# Altium footprint library Header.PcbLib: 297 footprints (part 14 of 23) (continued)
## MHDR1X22-254P [mm] "Male Header 1X22 with 2.54 mm Pitch"
height 8.4
pads (22):
  rect 1.5x1.5 hole 0.9: 1(-26.67,0)
  round 1.5 hole 0.9: 2(-24.13,0) 3(-21.59,0) 4(-19.05,0) 5(-16.51,0) 6(-13.97,0) 7(-11.43,0) 8(-8.89,0) 9(-6.35,0) 10(-3.81,0) 11(-1.27,0) 12(1.27,0) 13(3.81,0) 14(6.35,0) 15(8.89,0) 16(11.43,0) 17(13.97,0) 18(16.51,0) 19(19.05,0) 20(21.59,0) 21(24.13,0) 22(26.67,0)
Top Overlay:
  drawing of 155 lines, arcs and shapes, not listed
  text "1" at -26.162,-1.936 h1
  text "1" at -26.162,-1.936 h1
  text "2" at -23.622,-2.364 h1
  text "3" at -21.082,-2.364 h1
  text "4" at -18.542,-2.412 h1
  text "5" at -16.002,-2.364 h1
  text "6" at -13.462,-2.317 h1
  text "7" at -10.922,-2.364 h1
  text "8" at -8.382,-2.364 h1
  text "9" at -5.842,-2.317 h1
  text "10" at -3.302,-3.097 h1
  text "11" at -0.762,-2.669 h1
  text "12" at 1.778,-3.097 h1
  text "13" at 4.318,-3.097 h1
  text "14" at 6.858,-3.145 h1
  text "15" at 9.398,-3.097 h1
  text "16" at 11.938,-3.05 h1
  text "17" at 14.478,-3.097 h1
  text "18" at 17.018,-3.097 h1
  text "19" at 19.558,-3.05 h1
  text "20" at 22.098,-3.254 h1
  text "21" at 24.638,-2.826 h1
  text "22" at 27.178,-3.254 h1
3D body "PIN.STEP": height 8.43, standoff -2.49, extent 25.4,-1.27 27.94,1.27
3D body "PIN_mid.STEP": height 8.43, standoff -2.49, extent 22.86,-1.27 25.4,1.27
3D body "PIN_mid.STEP": height 8.43, standoff -2.49, extent 20.32,-1.27 22.86,1.27
3D body "PIN_mid.STEP": height 8.43, standoff -2.49, extent 17.78,-1.27 20.32,1.27
3D body "PIN_mid.STEP": height 8.43, standoff -2.49, extent 15.24,-1.27 17.78,1.27
3D body "PIN_mid.STEP": height 8.43, standoff -2.49, extent 12.7,-1.27 15.24,1.27
3D body "PIN_mid.STEP": height 8.43, standoff -2.49, extent 10.16,-1.27 12.7,1.27
3D body "PIN_mid.STEP": height 8.43, standoff -2.49, extent 7.62,-1.27 10.16,1.27
3D body "PIN_mid.STEP": height 8.43, standoff -2.49, extent 5.08,-1.27 7.62,1.27
3D body "PIN_mid.STEP": height 8.43, standoff -2.49, extent 2.54,-1.27 5.08,1.27
3D body "PIN_mid.STEP": height 8.43, standoff -2.49, extent 0,-1.27 2.54,1.27
3D body "PIN_mid.STEP": height 8.43, standoff -2.49, extent -2.54,-1.27 0,1.27
3D body "PIN_mid.STEP": height 8.43, standoff -2.49, extent -5.08,-1.27 -2.54,1.27
3D body "PIN_mid.STEP": height 8.43, standoff -2.49, extent -7.62,-1.27 -5.08,1.27
3D body "PIN_mid.STEP": height 8.43, standoff -2.49, extent -10.16,-1.27 -7.62,1.27
3D body "PIN_mid.STEP": height 8.43, standoff -2.49, extent -12.7,-1.27 -10.16,1.27
3D body "PIN_mid.STEP": height 8.43, standoff -2.49, extent -15.24,-1.27 -12.7,1.27
3D body "PIN_mid.STEP": height 8.43, standoff -2.49, extent -17.78,-1.27 -15.24,1.27
3D body "PIN_mid.STEP": height 8.43, standoff -2.49, extent -20.32,-1.27 -17.78,1.27
3D body "PIN_mid.STEP": height 8.43, standoff -2.49, extent -22.86,-1.27 -20.32,1.27
3D body "PIN_mid.STEP": height 8.43, standoff -2.49, extent -25.4,-1.27 -22.86,1.27
3D body "PIN.STEP": height 8.43, standoff -2.49, extent -27.94,-1.27 -25.4,1.27

## MHDR1X22-254P - E [mm] "Male Header 1X22 with 2.54 mm Pitch"
height 8.4
pads (22):
  rect 1.5x1.5 hole 0.9: 1(-26.67,0)
  round 1.5 hole 0.9: 2(-24.13,0) 3(-21.59,0) 4(-19.05,0) 5(-16.51,0) 6(-13.97,0) 7(-11.43,0) 8(-8.89,0) 9(-6.35,0) 10(-3.81,0) 11(-1.27,0) 12(1.27,0) 13(3.81,0) 14(6.35,0) 15(8.89,0) 16(11.43,0) 17(13.97,0) 18(16.51,0) 19(19.05,0) 20(21.59,0) 21(24.13,0) 22(26.67,0)
Top Overlay:
  drawing of 155 lines, arcs and shapes, not listed
3D body "PIN.STEP": height 8.43, standoff -2.49, extent 25.4,-1.27 27.94,1.27
3D body "PIN_mid.STEP": height 8.43, standoff -2.49, extent 22.86,-1.27 25.4,1.27
3D body "PIN_mid.STEP": height 8.43, standoff -2.49, extent 20.32,-1.27 22.86,1.27
3D body "PIN_mid.STEP": height 8.43, standoff -2.49, extent 17.78,-1.27 20.32,1.27
3D body "PIN_mid.STEP": height 8.43, standoff -2.49, extent 15.24,-1.27 17.78,1.27
3D body "PIN_mid.STEP": height 8.43, standoff -2.49, extent 12.7,-1.27 15.24,1.27
3D body "PIN_mid.STEP": height 8.43, standoff -2.49, extent 10.16,-1.27 12.7,1.27
3D body "PIN_mid.STEP": height 8.43, standoff -2.49, extent 7.62,-1.27 10.16,1.27
3D body "PIN_mid.STEP": height 8.43, standoff -2.49, extent 5.08,-1.27 7.62,1.27
3D body "PIN_mid.STEP": height 8.43, standoff -2.49, extent 2.54,-1.27 5.08,1.27
3D body "PIN_mid.STEP": height 8.43, standoff -2.49, extent 0,-1.27 2.54,1.27
3D body "PIN_mid.STEP": height 8.43, standoff -2.49, extent -2.54,-1.27 0,1.27
3D body "PIN_mid.STEP": height 8.43, standoff -2.49, extent -5.08,-1.27 -2.54,1.27
3D body "PIN_mid.STEP": height 8.43, standoff -2.49, extent -7.62,-1.27 -5.08,1.27
3D body "PIN_mid.STEP": height 8.43, standoff -2.49, extent -10.16,-1.27 -7.62,1.27
3D body "PIN_mid.STEP": height 8.43, standoff -2.49, extent -12.7,-1.27 -10.16,1.27
3D body "PIN_mid.STEP": height 8.43, standoff -2.49, extent -15.24,-1.27 -12.7,1.27
3D body "PIN_mid.STEP": height 8.43, standoff -2.49, extent -17.78,-1.27 -15.24,1.27
3D body "PIN_mid.STEP": height 8.43, standoff -2.49, extent -20.32,-1.27 -17.78,1.27
3D body "PIN_mid.STEP": height 8.43, standoff -2.49, extent -22.86,-1.27 -20.32,1.27
3D body "PIN_mid.STEP": height 8.43, standoff -2.49, extent -25.4,-1.27 -22.86,1.27
3D body "PIN.STEP": height 8.43, standoff -2.49, extent -27.94,-1.27 -25.4,1.27

## MHDR1X24-254P [mm] "Male Header 1X24 with 2.54 mm Pitch"
height 8.4
pads (24):
  rect 1.5x1.5 hole 0.9: 1(-29.21,0)
  round 1.5 hole 0.9: 2(-26.67,0) 3(-24.13,0) 4(-21.59,0) 5(-19.05,0) 6(-16.51,0) 7(-13.97,0) 8(-11.43,0) 9(-8.89,0) 10(-6.35,0) 11(-3.81,0) 12(-1.27,0) 13(1.27,0) 14(3.81,0) 15(6.35,0) 16(8.89,0) 17(11.43,0) 18(13.97,0) 19(16.51,0) 20(19.05,0) 21(21.59,0) 22(24.13,0) 23(26.67,0) 24(29.21,0)
Top Overlay:
  drawing of 169 lines, arcs and shapes, not listed
  text "24" at 29.718,-3.302 h1
  text "23" at 27.178,-3.254 h1
  text "22" at 24.638,-3.254 h1
  text "21" at 22.098,-2.826 h1
  text "20" at 19.558,-3.254 h1
  text "19" at 17.018,-3.05 h1
  text "18" at 14.478,-3.097 h1
  text "17" at 11.938,-3.097 h1
  text "16" at 9.398,-3.05 h1
  text "15" at 6.858,-3.097 h1
  text "14" at 4.318,-3.145 h1
  text "13" at 1.778,-3.097 h1
  text "12" at -0.762,-3.097 h1
  text "11" at -3.302,-2.669 h1
  text "10" at -5.842,-3.097 h1
  text "9" at -8.382,-2.317 h1
  text "8" at -10.922,-2.364 h1
  text "7" at -13.462,-2.364 h1
  text "6" at -16.002,-2.317 h1
  text "5" at -18.542,-2.364 h1
  text "4" at -21.082,-2.412 h1
  text "3" at -23.622,-2.364 h1
  text "2" at -26.162,-2.364 h1
  text "1" at -28.702,-1.936 h1
  text "1" at -28.702,-1.936 h1
3D body "PIN_mid.STEP": height 8.43, standoff -2.49, extent -20.32,-1.27 -17.78,1.27
3D body "PIN_mid.STEP": height 8.43, standoff -2.49, extent -22.86,-1.27 -20.32,1.27
3D body "PIN_mid.STEP": height 8.43, standoff -2.49, extent -25.4,-1.27 -22.86,1.27
3D body "PIN_mid.STEP": height 8.43, standoff -2.49, extent -27.94,-1.27 -25.4,1.27
3D body "PIN.STEP": height 8.43, standoff -2.49, extent -30.48,-1.27 -27.94,1.27
3D body "PIN.STEP": height 8.43, standoff -2.49, extent 27.94,-1.27 30.48,1.27
3D body "PIN_mid.STEP": height 8.43, standoff -2.49, extent 25.4,-1.27 27.94,1.27
3D body "PIN_mid.STEP": height 8.43, standoff -2.49, extent 22.86,-1.27 25.4,1.27
3D body "PIN_mid.STEP": height 8.43, standoff -2.49, extent 20.32,-1.27 22.86,1.27
3D body "PIN_mid.STEP": height 8.43, standoff -2.49, extent 17.78,-1.27 20.32,1.27
3D body "PIN_mid.STEP": height 8.43, standoff -2.49, extent 15.24,-1.27 17.78,1.27
3D body "PIN_mid.STEP": height 8.43, standoff -2.49, extent 12.7,-1.27 15.24,1.27
3D body "PIN_mid.STEP": height 8.43, standoff -2.49, extent 10.16,-1.27 12.7,1.27
3D body "PIN_mid.STEP": height 8.43, standoff -2.49, extent 7.62,-1.27 10.16,1.27
3D body "PIN_mid.STEP": height 8.43, standoff -2.49, extent 5.08,-1.27 7.62,1.27
3D body "PIN_mid.STEP": height 8.43, standoff -2.49, extent 2.54,-1.27 5.08,1.27
3D body "PIN_mid.STEP": height 8.43, standoff -2.49, extent 0,-1.27 2.54,1.27
3D body "PIN_mid.STEP": height 8.43, standoff -2.49, extent -2.54,-1.27 0,1.27
3D body "PIN_mid.STEP": height 8.43, standoff -2.49, extent -5.08,-1.27 -2.54,1.27
3D body "PIN_mid.STEP": height 8.43, standoff -2.49, extent -7.62,-1.27 -5.08,1.27
3D body "PIN_mid.STEP": height 8.43, standoff -2.49, extent -10.16,-1.27 -7.62,1.27
3D body "PIN_mid.STEP": height 8.43, standoff -2.49, extent -12.7,-1.27 -10.16,1.27
3D body "PIN_mid.STEP": height 8.43, standoff -2.49, extent -15.24,-1.27 -12.7,1.27
3D body "PIN_mid.STEP": height 8.43, standoff -2.49, extent -17.78,-1.27 -15.24,1.27

## MHDR1X24-254P - E [mm] "Male Header 1X24 with 2.54 mm Pitch"
height 8.4
pads (24):
  rect 1.5x1.5 hole 0.9: 1(-29.21,0)
  round 1.5 hole 0.9: 2(-26.67,0) 3(-24.13,0) 4(-21.59,0) 5(-19.05,0) 6(-16.51,0) 7(-13.97,0) 8(-11.43,0) 9(-8.89,0) 10(-6.35,0) 11(-3.81,0) 12(-1.27,0) 13(1.27,0) 14(3.81,0) 15(6.35,0) 16(8.89,0) 17(11.43,0) 18(13.97,0) 19(16.51,0) 20(19.05,0) 21(21.59,0) 22(24.13,0) 23(26.67,0) 24(29.21,0)
Top Overlay:
  drawing of 169 lines, arcs and shapes, not listed
3D body "PIN.STEP": height 8.43, standoff -2.49, extent 27.94,-1.27 30.48,1.27
3D body "PIN_mid.STEP": height 8.43, standoff -2.49, extent 25.4,-1.27 27.94,1.27
3D body "PIN_mid.STEP": height 8.43, standoff -2.49, extent 22.86,-1.27 25.4,1.27
3D body "PIN_mid.STEP": height 8.43, standoff -2.49, extent 20.32,-1.27 22.86,1.27
3D body "PIN_mid.STEP": height 8.43, standoff -2.49, extent 17.78,-1.27 20.32,1.27
3D body "PIN_mid.STEP": height 8.43, standoff -2.49, extent 15.24,-1.27 17.78,1.27
3D body "PIN_mid.STEP": height 8.43, standoff -2.49, extent 12.7,-1.27 15.24,1.27
3D body "PIN_mid.STEP": height 8.43, standoff -2.49, extent 10.16,-1.27 12.7,1.27
3D body "PIN_mid.STEP": height 8.43, standoff -2.49, extent 7.62,-1.27 10.16,1.27
3D body "PIN_mid.STEP": height 8.43, standoff -2.49, extent 5.08,-1.27 7.62,1.27
3D body "PIN_mid.STEP": height 8.43, standoff -2.49, extent 2.54,-1.27 5.08,1.27
3D body "PIN_mid.STEP": height 8.43, standoff -2.49, extent 0,-1.27 2.54,1.27
3D body "PIN_mid.STEP": height 8.43, standoff -2.49, extent -2.54,-1.27 0,1.27
3D body "PIN_mid.STEP": height 8.43, standoff -2.49, extent -5.08,-1.27 -2.54,1.27
3D body "PIN_mid.STEP": height 8.43, standoff -2.49, extent -7.62,-1.27 -5.08,1.27
3D body "PIN_mid.STEP": height 8.43, standoff -2.49, extent -10.16,-1.27 -7.62,1.27
3D body "PIN_mid.STEP": height 8.43, standoff -2.49, extent -12.7,-1.27 -10.16,1.27
3D body "PIN_mid.STEP": height 8.43, standoff -2.49, extent -15.24,-1.27 -12.7,1.27
3D body "PIN_mid.STEP": height 8.43, standoff -2.49, extent -17.78,-1.27 -15.24,1.27
3D body "PIN_mid.STEP": height 8.43, standoff -2.49, extent -20.32,-1.27 -17.78,1.27
3D body "PIN_mid.STEP": height 8.43, standoff -2.49, extent -22.86,-1.27 -20.32,1.27
3D body "PIN_mid.STEP": height 8.43, standoff -2.49, extent -25.4,-1.27 -22.86,1.27
3D body "PIN_mid.STEP": height 8.43, standoff -2.49, extent -27.94,-1.27 -25.4,1.27
3D body "PIN.STEP": height 8.43, standoff -2.49, extent -30.48,-1.27 -27.94,1.27

## MHDR1X25-254P [mm] "Male Header 1X25 with 2.54 mm Pitch"
height 8.4
pads (25):
  rect 1.5x1.5 hole 0.9: 1(-30.48,0)
  round 1.5 hole 0.9: 2(-27.94,0) 3(-25.4,0) 4(-22.86,0) 5(-20.32,0) 6(-17.78,0) 7(-15.24,0) 8(-12.7,0) 9(-10.16,0) 10(-7.62,0) 11(-5.08,0) 12(-2.54,0) 13(0,0) 14(2.54,0) 15(5.08,0) 16(7.62,0) 17(10.16,0) 18(12.7,0) 19(15.24,0) 20(17.78,0) 21(20.32,0) 22(22.86,0) 23(25.4,0) 24(27.94,0) 25(30.48,0)
Top Overlay:
  drawing of 176 lines, arcs and shapes, not listed
  text "1" at -29.972,-1.936 h1
  text "1" at -29.972,-1.936 h1
  text "2" at -27.432,-2.364 h1
  text "3" at -24.892,-2.364 h1
  text "4" at -22.352,-2.412 h1
  text "5" at -19.812,-2.364 h1
  text "6" at -17.272,-2.317 h1
  text "7" at -14.732,-2.364 h1
  text "8" at -12.192,-2.364 h1
  text "9" at -9.652,-2.317 h1
  text "10" at -7.112,-3.097 h1
  text "11" at -4.572,-2.669 h1
  text "12" at -2.032,-3.097 h1
  text "13" at 0.508,-3.097 h1
  text "14" at 3.048,-3.145 h1
  text "15" at 5.588,-3.097 h1
  text "16" at 8.128,-3.05 h1
  text "17" at 10.668,-3.097 h1
  text "18" at 13.208,-3.097 h1
  text "19" at 15.748,-3.05 h1
  text "20" at 18.288,-3.254 h1
  text "21" at 20.828,-2.826 h1
  text "22" at 23.368,-3.254 h1
  text "23" at 25.908,-3.254 h1
  text "24" at 28.448,-3.302 h1
  text "25" at 30.988,-3.254 h1
3D body "PIN.STEP": height 8.43, standoff -2.49, extent 29.21,-1.27 31.75,1.27
3D body "PIN_mid.STEP": height 8.43, standoff -2.49, extent 26.67,-1.27 29.21,1.27
3D body "PIN_mid.STEP": height 8.43, standoff -2.49, extent 24.13,-1.27 26.67,1.27
3D body "PIN_mid.STEP": height 8.43, standoff -2.49, extent 21.59,-1.27 24.13,1.27
3D body "PIN_mid.STEP": height 8.43, standoff -2.49, extent 19.05,-1.27 21.59,1.27
3D body "PIN_mid.STEP": height 8.43, standoff -2.49, extent 16.51,-1.27 19.05,1.27
3D body "PIN_mid.STEP": height 8.43, standoff -2.49, extent 13.97,-1.27 16.51,1.27
3D body "PIN_mid.STEP": height 8.43, standoff -2.49, extent 11.43,-1.27 13.97,1.27
3D body "PIN_mid.STEP": height 8.43, standoff -2.49, extent 8.89,-1.27 11.43,1.27
3D body "PIN_mid.STEP": height 8.43, standoff -2.49, extent 6.35,-1.27 8.89,1.27
3D body "PIN_mid.STEP": height 8.43, standoff -2.49, extent 3.81,-1.27 6.35,1.27
3D body "PIN_mid.STEP": height 8.43, standoff -2.49, extent 1.27,-1.27 3.81,1.27
3D body "PIN_mid.STEP": height 8.43, standoff -2.49, extent -1.27,-1.27 1.27,1.27
3D body "PIN_mid.STEP": height 8.43, standoff -2.49, extent -3.81,-1.27 -1.27,1.27
3D body "PIN_mid.STEP": height 8.43, standoff -2.49, extent -6.35,-1.27 -3.81,1.27
3D body "PIN_mid.STEP": height 8.43, standoff -2.49, extent -8.89,-1.27 -6.35,1.27
3D body "PIN_mid.STEP": height 8.43, standoff -2.49, extent -11.43,-1.27 -8.89,1.27
3D body "PIN_mid.STEP": height 8.43, standoff -2.49, extent -13.97,-1.27 -11.43,1.27
3D body "PIN_mid.STEP": height 8.43, standoff -2.49, extent -16.51,-1.27 -13.97,1.27
3D body "PIN_mid.STEP": height 8.43, standoff -2.49, extent -19.05,-1.27 -16.51,1.27
3D body "PIN_mid.STEP": height 8.43, standoff -2.49, extent -21.59,-1.27 -19.05,1.27
3D body "PIN_mid.STEP": height 8.43, standoff -2.49, extent -24.13,-1.27 -21.59,1.27
3D body "PIN_mid.STEP": height 8.43, standoff -2.49, extent -26.67,-1.27 -24.13,1.27
3D body "PIN_mid.STEP": height 8.43, standoff -2.49, extent -29.21,-1.27 -26.67,1.27
3D body "PIN.STEP": height 8.43, standoff -2.49, extent -31.75,-1.27 -29.21,1.27

## MHDR1X25-254P - E [mm] "Male Header 1X25 with 2.54 mm Pitch"
height 8.4
pads (25):
  rect 1.5x1.5 hole 0.9: 1(-30.48,0)
  round 1.5 hole 0.9: 2(-27.94,0) 3(-25.4,0) 4(-22.86,0) 5(-20.32,0) 6(-17.78,0) 7(-15.24,0) 8(-12.7,0) 9(-10.16,0) 10(-7.62,0) 11(-5.08,0) 12(-2.54,0) 13(0,0) 14(2.54,0) 15(5.08,0) 16(7.62,0) 17(10.16,0) 18(12.7,0) 19(15.24,0) 20(17.78,0) 21(20.32,0) 22(22.86,0) 23(25.4,0) 24(27.94,0) 25(30.48,0)
Top Overlay:
  drawing of 176 lines, arcs and shapes, not listed
3D body "PIN.STEP": height 8.43, standoff -2.49, extent 29.21,-1.27 31.75,1.27
3D body "PIN_mid.STEP": height 8.43, standoff -2.49, extent 26.67,-1.27 29.21,1.27
3D body "PIN_mid.STEP": height 8.43, standoff -2.49, extent 24.13,-1.27 26.67,1.27
3D body "PIN_mid.STEP": height 8.43, standoff -2.49, extent 21.59,-1.27 24.13,1.27
3D body "PIN_mid.STEP": height 8.43, standoff -2.49, extent 19.05,-1.27 21.59,1.27
3D body "PIN_mid.STEP": height 8.43, standoff -2.49, extent 16.51,-1.27 19.05,1.27
3D body "PIN_mid.STEP": height 8.43, standoff -2.49, extent 13.97,-1.27 16.51,1.27
3D body "PIN_mid.STEP": height 8.43, standoff -2.49, extent 11.43,-1.27 13.97,1.27
3D body "PIN_mid.STEP": height 8.43, standoff -2.49, extent 8.89,-1.27 11.43,1.27
3D body "PIN_mid.STEP": height 8.43, standoff -2.49, extent 6.35,-1.27 8.89,1.27
3D body "PIN_mid.STEP": height 8.43, standoff -2.49, extent 3.81,-1.27 6.35,1.27
3D body "PIN_mid.STEP": height 8.43, standoff -2.49, extent 1.27,-1.27 3.81,1.27
3D body "PIN_mid.STEP": height 8.43, standoff -2.49, extent -1.27,-1.27 1.27,1.27
3D body "PIN_mid.STEP": height 8.43, standoff -2.49, extent -3.81,-1.27 -1.27,1.27
3D body "PIN_mid.STEP": height 8.43, standoff -2.49, extent -6.35,-1.27 -3.81,1.27
3D body "PIN_mid.STEP": height 8.43, standoff -2.49, extent -8.89,-1.27 -6.35,1.27
3D body "PIN_mid.STEP": height 8.43, standoff -2.49, extent -11.43,-1.27 -8.89,1.27
3D body "PIN_mid.STEP": height 8.43, standoff -2.49, extent -13.97,-1.27 -11.43,1.27
3D body "PIN_mid.STEP": height 8.43, standoff -2.49, extent -16.51,-1.27 -13.97,1.27
3D body "PIN_mid.STEP": height 8.43, standoff -2.49, extent -19.05,-1.27 -16.51,1.27
3D body "PIN_mid.STEP": height 8.43, standoff -2.49, extent -21.59,-1.27 -19.05,1.27
3D body "PIN_mid.STEP": height 8.43, standoff -2.49, extent -24.13,-1.27 -21.59,1.27
3D body "PIN_mid.STEP": height 8.43, standoff -2.49, extent -26.67,-1.27 -24.13,1.27
3D body "PIN_mid.STEP": height 8.43, standoff -2.49, extent -29.21,-1.27 -26.67,1.27
3D body "PIN.STEP": height 8.43, standoff -2.49, extent -31.75,-1.27 -29.21,1.27

## MHDR1X26-254P [mm] "Male Header 1X26 with 2.54 mm Pitch"
height 8.4
pads (26):
  rect 1.5x1.5 hole 0.9: 1(-31.75,0)
  round 1.5 hole 0.9: 2(-29.21,0) 3(-26.67,0) 4(-24.13,0) 5(-21.59,0) 6(-19.05,0) 7(-16.51,0) 8(-13.97,0) 9(-11.43,0) 10(-8.89,0) 11(-6.35,0) 12(-3.81,0) 13(-1.27,0) 14(1.27,0) 15(3.81,0) 16(6.35,0) 17(8.89,0) 18(11.43,0) 19(13.97,0) 20(16.51,0) 21(19.05,0) 22(21.59,0) 23(24.13,0) 24(26.67,0) 25(29.21,0) 26(31.75,0)
Top Overlay:
  drawing of 183 lines, arcs and shapes, not listed
  text "26" at 32.258,-3.207 h1
  text "25" at 29.718,-3.254 h1
  text "24" at 27.178,-3.302 h1
  text "23" at 24.638,-3.254 h1
  text "22" at 22.098,-3.254 h1
  text "21" at 19.558,-2.826 h1
  text "20" at 17.018,-3.254 h1
  text "19" at 14.478,-3.05 h1
  text "18" at 11.938,-3.097 h1
  text "17" at 9.398,-3.097 h1
  text "16" at 6.858,-3.05 h1
  text "15" at 4.318,-3.097 h1
  text "14" at 1.778,-3.145 h1
  text "13" at -0.762,-3.097 h1
  text "12" at -3.302,-3.097 h1
  text "11" at -5.842,-2.669 h1
  text "10" at -8.382,-3.097 h1
  text "9" at -10.922,-2.317 h1
  text "8" at -13.462,-2.364 h1
  text "7" at -16.002,-2.364 h1
  text "6" at -18.542,-2.317 h1
  text "5" at -21.082,-2.364 h1
  text "4" at -23.622,-2.412 h1
  text "3" at -26.162,-2.364 h1
  text "2" at -28.702,-2.364 h1
  text "1" at -31.242,-1.936 h1
  text "1" at -31.242,-1.936 h1
3D body "PIN_mid.STEP": height 8.43, standoff -2.49, extent 10.16,-1.27 12.7,1.27
3D body "PIN_mid.STEP": height 8.43, standoff -2.49, extent 7.62,-1.27 10.16,1.27
3D body "PIN_mid.STEP": height 8.43, standoff -2.49, extent 5.08,-1.27 7.62,1.27
3D body "PIN_mid.STEP": height 8.43, standoff -2.49, extent 2.54,-1.27 5.08,1.27
3D body "PIN_mid.STEP": height 8.43, standoff -2.49, extent 0,-1.27 2.54,1.27
3D body "PIN_mid.STEP": height 8.43, standoff -2.49, extent -2.54,-1.27 0,1.27
3D body "PIN_mid.STEP": height 8.43, standoff -2.49, extent -5.08,-1.27 -2.54,1.27
3D body "PIN_mid.STEP": height 8.43, standoff -2.49, extent -7.62,-1.27 -5.08,1.27
3D body "PIN_mid.STEP": height 8.43, standoff -2.49, extent -10.16,-1.27 -7.62,1.27
3D body "PIN_mid.STEP": height 8.43, standoff -2.49, extent -12.7,-1.27 -10.16,1.27
3D body "PIN_mid.STEP": height 8.43, standoff -2.49, extent -15.24,-1.27 -12.7,1.27
3D body "PIN_mid.STEP": height 8.43, standoff -2.49, extent -17.78,-1.27 -15.24,1.27
3D body "PIN_mid.STEP": height 8.43, standoff -2.49, extent -20.32,-1.27 -17.78,1.27
3D body "PIN_mid.STEP": height 8.43, standoff -2.49, extent -22.86,-1.27 -20.32,1.27
3D body "PIN_mid.STEP": height 8.43, standoff -2.49, extent -25.4,-1.27 -22.86,1.27
3D body "PIN_mid.STEP": height 8.43, standoff -2.49, extent -27.94,-1.27 -25.4,1.27
3D body "PIN_mid.STEP": height 8.43, standoff -2.49, extent -30.48,-1.27 -27.94,1.27
3D body "PIN.STEP": height 8.43, standoff -2.49, extent -33.02,-1.27 -30.48,1.27
3D body "PIN.STEP": height 8.43, standoff -2.49, extent 30.48,-1.27 33.02,1.27
3D body "PIN_mid.STEP": height 8.43, standoff -2.49, extent 27.94,-1.27 30.48,1.27
3D body "PIN_mid.STEP": height 8.43, standoff -2.49, extent 25.4,-1.27 27.94,1.27
3D body "PIN_mid.STEP": height 8.43, standoff -2.49, extent 22.86,-1.27 25.4,1.27
3D body "PIN_mid.STEP": height 8.43, standoff -2.49, extent 20.32,-1.27 22.86,1.27
3D body "PIN_mid.STEP": height 8.43, standoff -2.49, extent 17.78,-1.27 20.32,1.27
3D body "PIN_mid.STEP": height 8.43, standoff -2.49, extent 15.24,-1.27 17.78,1.27
3D body "PIN_mid.STEP": height 8.43, standoff -2.49, extent 12.7,-1.27 15.24,1.27

## MHDR1X26-254P - E [mm] "Male Header 1X26 with 2.54 mm Pitch"
height 8.4
pads (26):
  rect 1.5x1.5 hole 0.9: 1(-31.75,0)
  round 1.5 hole 0.9: 2(-29.21,0) 3(-26.67,0) 4(-24.13,0) 5(-21.59,0) 6(-19.05,0) 7(-16.51,0) 8(-13.97,0) 9(-11.43,0) 10(-8.89,0) 11(-6.35,0) 12(-3.81,0) 13(-1.27,0) 14(1.27,0) 15(3.81,0) 16(6.35,0) 17(8.89,0) 18(11.43,0) 19(13.97,0) 20(16.51,0) 21(19.05,0) 22(21.59,0) 23(24.13,0) 24(26.67,0) 25(29.21,0) 26(31.75,0)
Top Overlay:
  drawing of 183 lines, arcs and shapes, not listed
3D body "PIN.STEP": height 8.43, standoff -2.49, extent -33.02,-1.27 -30.48,1.27
3D body "PIN_mid.STEP": height 8.43, standoff -2.49, extent -30.48,-1.27 -27.94,1.27
3D body "PIN_mid.STEP": height 8.43, standoff -2.49, extent -27.94,-1.27 -25.4,1.27
3D body "PIN_mid.STEP": height 8.43, standoff -2.49, extent -25.4,-1.27 -22.86,1.27
3D body "PIN_mid.STEP": height 8.43, standoff -2.49, extent -22.86,-1.27 -20.32,1.27
3D body "PIN_mid.STEP": height 8.43, standoff -2.49, extent -20.32,-1.27 -17.78,1.27
3D body "PIN_mid.STEP": height 8.43, standoff -2.49, extent -17.78,-1.27 -15.24,1.27
3D body "PIN_mid.STEP": height 8.43, standoff -2.49, extent -15.24,-1.27 -12.7,1.27
3D body "PIN_mid.STEP": height 8.43, standoff -2.49, extent -12.7,-1.27 -10.16,1.27
3D body "PIN_mid.STEP": height 8.43, standoff -2.49, extent -10.16,-1.27 -7.62,1.27
3D body "PIN_mid.STEP": height 8.43, standoff -2.49, extent -7.62,-1.27 -5.08,1.27
3D body "PIN_mid.STEP": height 8.43, standoff -2.49, extent -5.08,-1.27 -2.54,1.27
3D body "PIN_mid.STEP": height 8.43, standoff -2.49, extent -2.54,-1.27 0,1.27
3D body "PIN_mid.STEP": height 8.43, standoff -2.49, extent 0,-1.27 2.54,1.27
3D body "PIN_mid.STEP": height 8.43, standoff -2.49, extent 2.54,-1.27 5.08,1.27
3D body "PIN_mid.STEP": height 8.43, standoff -2.49, extent 5.08,-1.27 7.62,1.27
3D body "PIN_mid.STEP": height 8.43, standoff -2.49, extent 7.62,-1.27 10.16,1.27
3D body "PIN_mid.STEP": height 8.43, standoff -2.49, extent 10.16,-1.27 12.7,1.27
3D body "PIN_mid.STEP": height 8.43, standoff -2.49, extent 12.7,-1.27 15.24,1.27
3D body "PIN_mid.STEP": height 8.43, standoff -2.49, extent 15.24,-1.27 17.78,1.27
3D body "PIN_mid.STEP": height 8.43, standoff -2.49, extent 17.78,-1.27 20.32,1.27
3D body "PIN_mid.STEP": height 8.43, standoff -2.49, extent 20.32,-1.27 22.86,1.27
3D body "PIN_mid.STEP": height 8.43, standoff -2.49, extent 22.86,-1.27 25.4,1.27
3D body "PIN_mid.STEP": height 8.43, standoff -2.49, extent 25.4,-1.27 27.94,1.27
3D body "PIN_mid.STEP": height 8.43, standoff -2.49, extent 27.94,-1.27 30.48,1.27
3D body "PIN.STEP": height 8.43, standoff -2.49, extent 30.48,-1.27 33.02,1.27

## MHDR1X28-254P [mm] "Male Header 1X28 with 2.54 mm Pitch"
height 8.4
pads (28):
  rect 1.5x1.5 hole 0.9: 1(-34.29,0)
  round 1.5 hole 0.9: 2(-31.75,0) 3(-29.21,0) 4(-26.67,0) 5(-24.13,0) 6(-21.59,0) 7(-19.05,0) 8(-16.51,0) 9(-13.97,0) 10(-11.43,0) 11(-8.89,0) 12(-6.35,0) 13(-3.81,0) 14(-1.27,0) 15(1.27,0) 16(3.81,0) 17(6.35,0) 18(8.89,0) 19(11.43,0) 20(13.97,0) 21(16.51,0) 22(19.05,0) 23(21.59,0) 24(24.13,0) 25(26.67,0) 26(29.21,0) 27(31.75,0) 28(34.29,0)
Top Overlay:
  drawing of 197 lines, arcs and shapes, not listed
  text "1" at -33.782,-1.936 h1
  text "1" at -33.782,-1.936 h1
  text "2" at -31.242,-2.364 h1
  text "3" at -28.702,-2.364 h1
  text "4" at -26.162,-2.412 h1
  text "5" at -23.622,-2.364 h1
  text "6" at -21.082,-2.317 h1
  text "7" at -18.542,-2.364 h1
  text "8" at -16.002,-2.364 h1
  text "9" at -13.462,-2.317 h1
  text "10" at -10.922,-3.097 h1
  text "11" at -8.382,-2.669 h1
  text "12" at -5.842,-3.097 h1
  text "13" at -3.302,-3.097 h1
  text "14" at -0.762,-3.145 h1
  text "15" at 1.778,-3.097 h1
  text "16" at 4.318,-3.05 h1
  text "17" at 6.858,-3.097 h1
  text "18" at 9.398,-3.097 h1
  text "19" at 11.938,-3.05 h1
  text "20" at 14.478,-3.254 h1
  text "21" at 17.018,-2.826 h1
  text "22" at 19.558,-3.254 h1
  text "23" at 22.098,-3.254 h1
  text "24" at 24.638,-3.302 h1
  text "25" at 27.178,-3.254 h1
  text "26" at 29.718,-3.207 h1
  text "27" at 32.258,-3.254 h1
  text "28" at 34.798,-3.254 h1
3D body "PIN.STEP": height 8.43, standoff -2.49, extent -35.56,-1.27 -33.02,1.27
3D body "PIN_mid.STEP": height 8.43, standoff -2.49, extent -33.02,-1.27 -30.48,1.27
3D body "PIN_mid.STEP": height 8.43, standoff -2.49, extent -30.48,-1.27 -27.94,1.27
3D body "PIN_mid.STEP": height 8.43, standoff -2.49, extent -27.94,-1.27 -25.4,1.27
3D body "PIN_mid.STEP": height 8.43, standoff -2.49, extent -25.4,-1.27 -22.86,1.27
3D body "PIN_mid.STEP": height 8.43, standoff -2.49, extent -22.86,-1.27 -20.32,1.27
3D body "PIN_mid.STEP": height 8.43, standoff -2.49, extent -20.32,-1.27 -17.78,1.27
3D body "PIN_mid.STEP": height 8.43, standoff -2.49, extent -17.78,-1.27 -15.24,1.27
3D body "PIN_mid.STEP": height 8.43, standoff -2.49, extent -15.24,-1.27 -12.7,1.27
3D body "PIN_mid.STEP": height 8.43, standoff -2.49, extent -12.7,-1.27 -10.16,1.27
3D body "PIN_mid.STEP": height 8.43, standoff -2.49, extent -10.16,-1.27 -7.62,1.27
3D body "PIN_mid.STEP": height 8.43, standoff -2.49, extent -7.62,-1.27 -5.08,1.27
3D body "PIN_mid.STEP": height 8.43, standoff -2.49, extent -5.08,-1.27 -2.54,1.27
3D body "PIN_mid.STEP": height 8.43, standoff -2.49, extent -2.54,-1.27 0,1.27
3D body "PIN_mid.STEP": height 8.43, standoff -2.49, extent 0,-1.27 2.54,1.27
3D body "PIN_mid.STEP": height 8.43, standoff -2.49, extent 2.54,-1.27 5.08,1.27
3D body "PIN_mid.STEP": height 8.43, standoff -2.49, extent 5.08,-1.27 7.62,1.27
3D body "PIN_mid.STEP": height 8.43, standoff -2.49, extent 7.62,-1.27 10.16,1.27
3D body "PIN_mid.STEP": height 8.43, standoff -2.49, extent 10.16,-1.27 12.7,1.27
3D body "PIN_mid.STEP": height 8.43, standoff -2.49, extent 12.7,-1.27 15.24,1.27
3D body "PIN_mid.STEP": height 8.43, standoff -2.49, extent 15.24,-1.27 17.78,1.27
3D body "PIN_mid.STEP": height 8.43, standoff -2.49, extent 17.78,-1.27 20.32,1.27
3D body "PIN_mid.STEP": height 8.43, standoff -2.49, extent 20.32,-1.27 22.86,1.27
3D body "PIN_mid.STEP": height 8.43, standoff -2.49, extent 22.86,-1.27 25.4,1.27
3D body "PIN_mid.STEP": height 8.43, standoff -2.49, extent 25.4,-1.27 27.94,1.27
3D body "PIN_mid.STEP": height 8.43, standoff -2.49, extent 27.94,-1.27 30.48,1.27
3D body "PIN_mid.STEP": height 8.43, standoff -2.49, extent 30.48,-1.27 33.02,1.27
3D body "PIN.STEP": height 8.43, standoff -2.49, extent 33.02,-1.27 35.56,1.27